# Altium footprint library Apalis Evaluation Board.PcbLib: 212 footprints (part 12 of 14)
Each footprint in its own frame and in the unit in brackets; x right, y up, seen from the top. Pads: shape width x height; smd on the part's side, far side on the other; paste and mask are expansions set on the pad; w line width, h text height; cw(c..) or ccw(c..) is an arc to the next point about the centre after c.
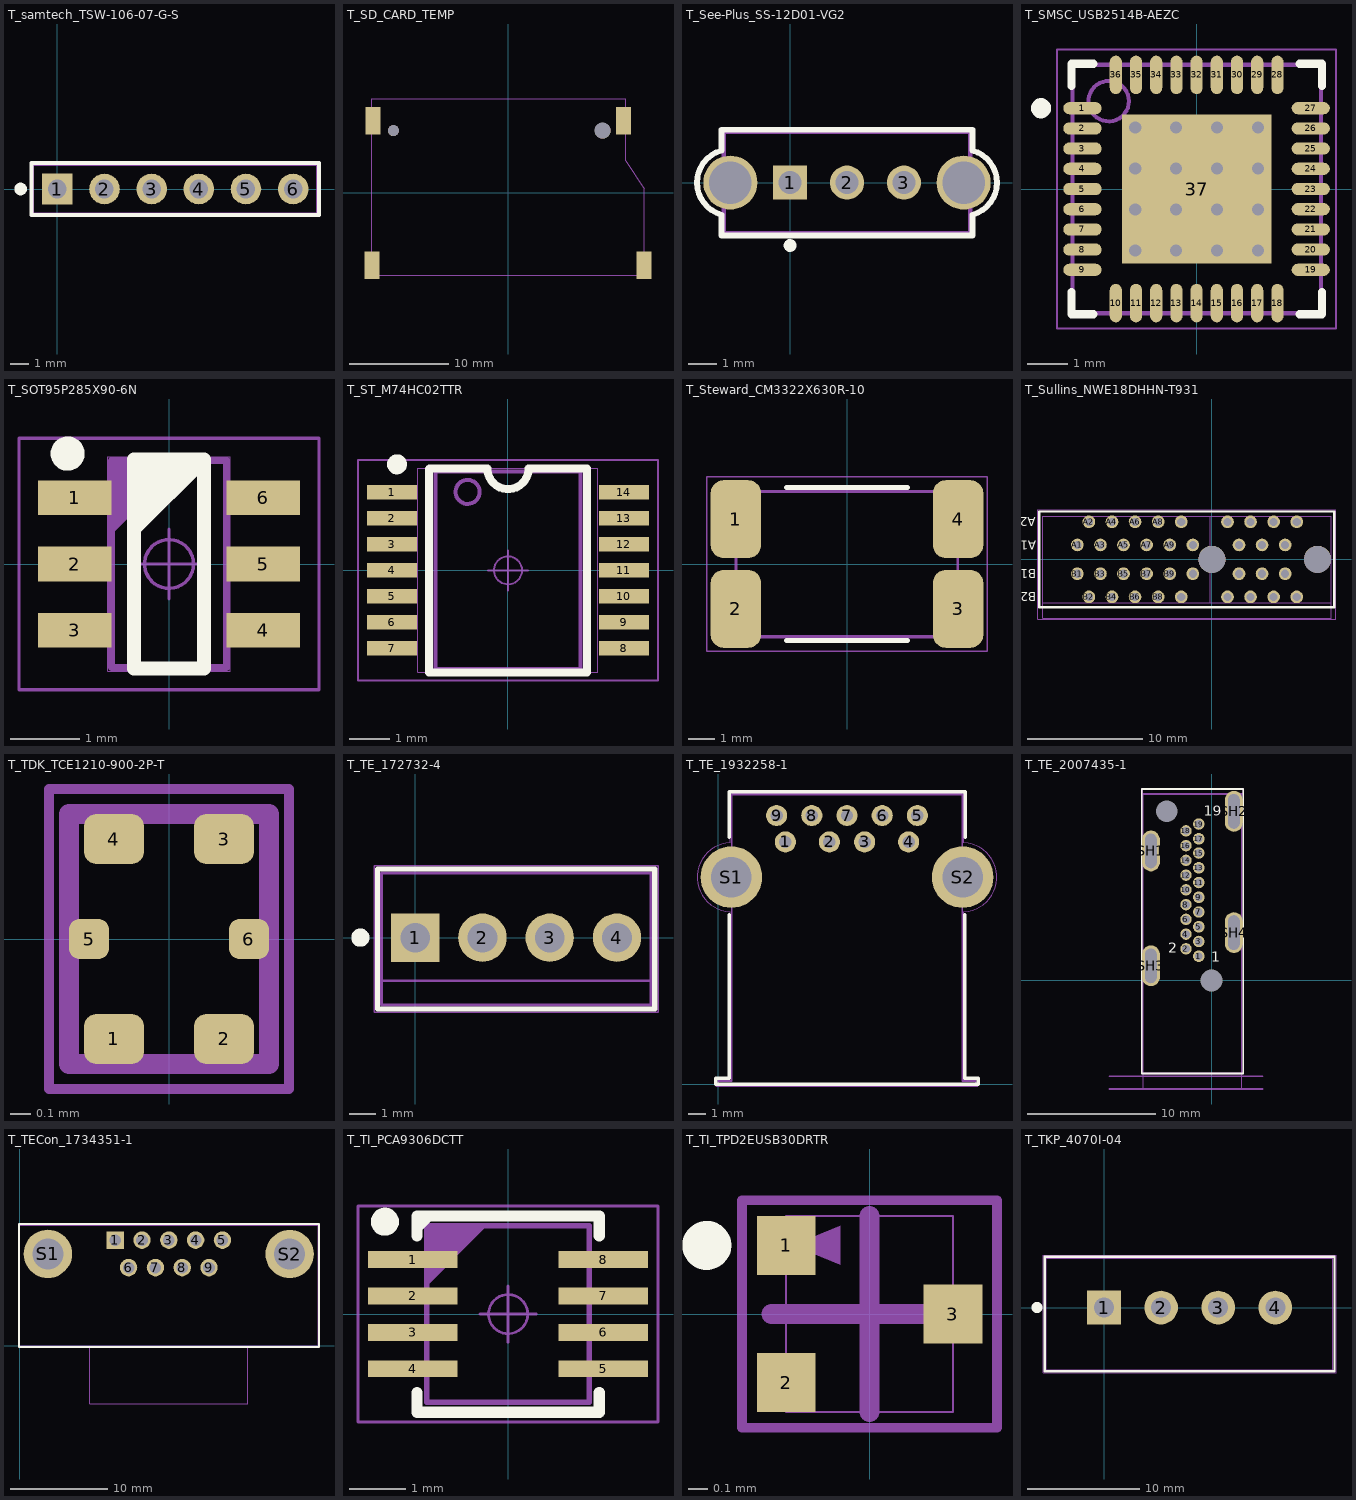
[diagram p11: the footprints below, top view; thin cyan lines are the x and y axes]

## T_samtech_TSW-106-07-G-S [mm] "Connector, Header, 6 Position, 2.54mm pitch"
height 8.4
pads (6):
  rect 1.65x1.65 hole 1: 1(0,0)
  round 1.65 hole 1: 2(2.54,0) 3(5.08,0) 4(7.62,0) 5(10.16,0) 6(12.7,0)
Top Overlay:
  circle w0.5: c-1.975,0 r0.088
  lines w0.2: -1.395,-1.395 -1.395,1.395 14.095,1.395 14.095,-1.395 -1.395,-1.395
Mechanical 1:
  lines w0.05: -1.37,-1.37 -1.37,1.37 14.07,1.37 14.07,-1.37 -1.37,-1.37
Mechanical 2:
  lines w0.01: -1.27,-1.27 -1.27,1.27 13.97,1.27 13.97,-1.27 -1.27,-1.27
Mechanical 3:
  lines w0.1: -1.37,-1.37 14.07,-1.37 14.07,1.37 -1.37,1.37 -1.37,-1.37

## T_SD_CARD_TEMP [mm]
height 2.85
pads (6):
  rect 1.5x2.8 smd: ""(-13.65,-7.25) ""(-13.53,7.25) ""(11.57,7.25) ""(13.65,-7.25)
  round 1.1 hole 1.1: ""(-11.5,6.25)
  round 1.6 hole 1.6: ""(9.5,6.25)
Mechanical 2:
  lines w0.001: -13.68,-8.25 13.68,-8.25 13.68,0.45 11.82,3.25 11.82,9.45 -13.68,9.45 -13.68,-8.25
3D body: height 2.85, standoff 0, extent -13.68,-8.25 13.68,9.45

## T_See-Plus_SS-12D01-VG2 [mm] "Slide Switch"
height 5.5
pads (5):
  rect 1.2x1.2 hole 0.8: 1(0,0)
  round 1.2 hole 0.8: 2(2,0) 3(4,0)
  round 1.9 hole 1.5: ""(-2.1,0) ""(6.1,0)
Top Overlay:
  circle w0.25: c0,-2.21 r0.1
  lines w0.2: -2.423,1.124 ccw(c-2.1,0) -2.422,-1.125 ; -2.41,-1.13 -2.41,-1.86 6.41,-1.86 6.41,-1.13 ; -2.41,1.13 -2.41,1.86 6.41,1.86 6.41,1.13 ; 6.422,1.125 cw(c6.1,0) 6.423,-1.124
Mechanical 1:
  lines w0.05: -2.38,-1.83 -2.38,1.83 6.38,1.83 6.38,-1.83 -2.38,-1.83
Mechanical 2:
  lines w0.001: -2.3,-1.75 -2.3,1.75 6.3,1.75 6.3,-1.75 -2.3,-1.75
Mechanical 3:
  lines w0.1: -2.3,-1.75 6.3,-1.75 6.3,1.75 -2.3,1.75 -2.3,-1.75
3D body: height 6.5, standoff 3.5, extent -0.711,-0.711 0.711,0.711
3D body: height 3.5, standoff 0, extent -2.3,-1.75 6.3,1.75

## T_SMSC_USB2514B-AEZC [mm] "QFN, 36-Leads, Body 6x6mm, Pitch 0.5mm, IPC High Density"
height 1
pads (37):
  oval 0.95x0.3 smd: 1(-2.825,2) 2(-2.825,1.5) 3(-2.825,1) 4(-2.825,0.5) 5(-2.825,0) 6(-2.825,-0.5) 7(-2.825,-1) 8(-2.825,-1.5) 9(-2.825,-2) 19(2.825,-2) 20(2.825,-1.5) 21(2.825,-1) 22(2.825,-0.5) 23(2.825,0) 24(2.825,0.5) 25(2.825,1) 26(2.825,1.5) 27(2.825,2)
  oval 0.3x0.95 smd: 10(-2,-2.825) 11(-1.5,-2.825) 12(-1,-2.825) 13(-0.5,-2.825) 14(0,-2.825) 15(0.5,-2.825) 16(1,-2.825) 17(1.5,-2.825) 18(2,-2.825) 28(2,2.825) 29(1.5,2.825) 30(1,2.825) 31(0.5,2.825) 32(0,2.825) 33(-0.5,2.825) 34(-1,2.825) 35(-1.5,2.825) 36(-2,2.825)
  rect 3.7x3.7 smd paste-3.7: 37(0,0)
via 1.52,1.52 diameter 0.6 hole 0.3
via 1.52,-1.52 diameter 0.6 hole 0.3
via -1.52,-1.52 diameter 0.6 hole 0.3
via -1.52,1.52 diameter 0.6 hole 0.3
via -0.507,1.52 diameter 0.6 hole 0.3
via 0.507,1.52 diameter 0.6 hole 0.3
via -1.52,0.507 diameter 0.6 hole 0.3
via -0.507,0.507 diameter 0.6 hole 0.3
via 0.507,0.507 diameter 0.6 hole 0.3
via 1.52,0.507 diameter 0.6 hole 0.3
via -1.52,-0.507 diameter 0.6 hole 0.3
via -0.507,-0.507 diameter 0.6 hole 0.3
via 0.507,-0.507 diameter 0.6 hole 0.3
via 1.52,-0.507 diameter 0.6 hole 0.3
via -0.507,-1.52 diameter 0.6 hole 0.3
via 0.507,-1.52 diameter 0.6 hole 0.3
Top Overlay:
  circle w0.25: c-3.85,2 r0.125
  lines w0.2: -3.1,-2.55 -3.1,-3.1 -2.55,-3.1 ; -3.1,2.55 -3.1,3.1 -2.55,3.1 ; 2.55,-3.1 3.1,-3.1 3.1,-2.55 ; 2.55,3.1 3.1,3.1 3.1,2.55
Top Paste:
  region: -1.778,0.762 -0.762,0.762 -0.762,1.778 -1.778,1.778
  region: -0.508,0.762 0.508,0.762 0.508,1.778 -0.508,1.778
  region: 0.762,1.778 0.762,0.762 1.778,0.762 1.778,1.778
  region: -1.778,-0.508 -0.762,-0.508 -0.762,0.508 -1.778,0.508
  region: -0.762,-1.778 -0.762,-0.762 -1.778,-0.762 -1.778,-1.778
  region: 0.508,-1.778 0.508,-0.762 -0.508,-0.762 -0.508,-1.778
  region: 1.778,-1.778 1.778,-0.762 0.762,-0.762 0.762,-1.778
  region: 0.509,-0.507 0.509,0.509 -0.507,0.509 -0.507,-0.507
  region: 1.778,-0.508 1.778,0.508 0.762,0.508 0.762,-0.508
Mechanical 1:
  lines w0.05: -3.45,-3.45 3.45,-3.45 3.45,3.45 -3.45,3.45 -3.45,-3.45
Mechanical 2:
  lines w0.001: -3.075,-3.075 3.075,-3.075 3.075,3.075 -3.075,3.075 -3.075,-3.075
Mechanical 3:
  circle w0.1: c-2.175,2.175 r0.5
  lines w0.1: -3.075,-3.075 -3.075,3.075 3.075,3.075 3.075,-3.075 -3.075,-3.075
3D body "User Library-QFN36 (6x6).STEP": height 0.91, standoff 0.01, extent -3.103,-3.103 3.103,3.103

## T_SOT95P285X90-6N [mm]
height 1.45
pads (6):
  rect 1.05x0.5 smd: 1(-1.35,0.95) 2(-1.35,0) 3(-1.35,-0.95) 4(1.35,-0.95) 5(1.35,0) 6(1.35,0.95)
Top Overlay:
  circle w0.25: c-1.453,1.582 r0.12
  lines w0.2: -0.5,0.5 0.5,1.5 ; -0.5,0.7 0.3,1.5 ; -0.5,0.9 0.1,1.5 ; -0.5,1.1 -0.1,1.5 ; -0.5,1.3 -0.3,1.5 ; 0.5,1.5 0.5,-1.5 -0.5,-1.5 -0.5,1.5 0.5,1.5
Mechanical 1:
  circle w0.05: c0,0 r0.35
  lines w0.05: -0.5,0 0.5,0 ; 0,-0.5 0,0.5 ; -2.15,-1.8 2.15,-1.8 2.15,1.8 -2.15,1.8 -2.15,-1.8
Mechanical 2:
  lines w0.001: -0.875,-1.535 0.875,-1.535 0.875,1.535 -0.875,1.535 -0.875,-1.535
Mechanical 3:
  lines w0.1: -0.825,0.485 0.175,1.485 ; -0.825,0.585 0.075,1.485 ; -0.825,0.685 -0.025,1.485 ; -0.825,0.785 -0.125,1.485 ; -0.825,0.885 -0.225,1.485 ; -0.825,0.985 -0.325,1.485 ; -0.825,1.085 -0.425,1.485 ; -0.825,1.185 -0.525,1.485 ; -0.825,1.285 -0.625,1.485 ; -0.825,1.385 -0.725,1.485 ; -0.825,-1.485 0.825,-1.485 0.825,1.485 -0.825,1.485 -0.825,-1.485
3D body: height 1.45, standoff 0, extent -0.875,-1.535 0.875,1.535

## T_ST_M74HC02TTR [mm] "Shrink Small Outline; 14 Leads; Body Width 4.4 mm; Pitch 0.65 mm"
height 1.15
pads (14):
  rect 1.26x0.36 smd: 1(-2.9,1.95) 2(-2.9,1.3) 3(-2.9,0.65) 4(-2.9,0) 5(-2.9,-0.65) 6(-2.9,-1.3) 7(-2.9,-1.95) 8(2.9,-1.95) 9(2.9,-1.3) 10(2.9,-0.65) 11(2.9,0) 12(2.9,0.65) 13(2.9,1.3) 14(2.9,1.95)
Top Overlay:
  circle w0.25: c-2.775,2.65 r0.125
  lines w0.2: -1.97,-2.55 1.97,-2.55 1.97,2.55 0.517,2.55 cw(c0,2.55) -0.517,2.55 -1.959,2.55 -1.97,2.539 -1.97,-2.55
Mechanical 1:
  circle w0.05: c0,0 r0.35
  lines w0.05: -0.5,0 0.5,0 ; 0,-0.5 0,0.5 ; -3.75,-2.75 3.75,-2.75 3.75,2.762 -3.75,2.762 -3.75,-2.75
Mechanical 2:
  lines w0.001: -2.25,-2.55 2.25,-2.55 2.25,2.55 -2.25,2.55 -2.25,-2.55
Mechanical 3:
  circle w0.1: c-1.008,1.961 r0.3
  lines w0.1: -1.817,-2.472 -1.817,2.466 1.815,2.466 1.815,-2.472 -1.817,-2.472
3D body: height 1.15, standoff 0, extent -2.25,-2.55 2.25,2.55

## T_Steward_CM3322X630R-10 [mm] "Common Mode Choke"
height 2.85
pads (4):
  rrect50% 1.91x2.95 smd: 1(-4.22,1.705) 2(-4.22,-1.705) 3(4.22,-1.705) 4(4.22,1.705)
Top Overlay:
  lines w0.2: -2.3,-2.902 2.3,-2.902 ; -2.3,2.904 2.3,2.904
Mechanical 1:
  lines w0.05: -5.316,-3.321 -5.316,3.321 5.316,3.321 5.316,-3.321 -5.316,-3.321
Mechanical 2:
  lines w0.001: -4.25,-2.8 -4.25,2.8 4.25,2.8 4.25,-2.8 -4.25,-2.8
Mechanical 3:
  lines w0.1: -4.2,-2.75 -4.2,2.75 4.2,2.75 4.2,-2.75 -4.2,-2.75

## T_Sullins_NWE18DHHN-T931 [mm] "PCIe X1 Slot"
height 8.8
pads (38):
  round 1.1 hole 0.7: A1(-11.65,1.25) A2(-10.65,3.25) A3(-9.65,1.25) A4(-8.65,3.25) A5(-7.65,1.25) A6(-6.65,3.25) A7(-5.65,1.25) A8(-4.65,3.25) A9(-3.65,1.25) A10(-2.65,3.25) A11(-1.65,1.25) A12(1.35,3.25) A13(2.35,1.25) A14(3.35,3.25) A15(4.35,1.25) A16(5.35,3.25) A17(6.35,1.25) A18(7.35,3.25) B1(-11.65,-1.25) B2(-10.65,-3.25) B3(-9.65,-1.25) B4(-8.65,-3.25) B5(-7.65,-1.25) B6(-6.65,-3.25) B7(-5.65,-1.25) B8(-4.65,-3.25) B9(-3.65,-1.25) B10(-2.65,-3.25) B11(-1.65,-1.25) B12(1.35,-3.25) B13(2.35,-1.25) B14(3.35,-3.25) B15(4.35,-1.25) B16(5.35,-3.25) B17(6.35,-1.25) B18(7.35,-3.25)
  round 2.35 hole 2.35 unplated paste+0 mask+0: ""(0,0) ""(9.15,0)
Top Overlay:
  lines w0.2: -14.95,-4.15 -14.95,4.15 10.6,4.15 10.6,-4.15 -14.95,-4.15
  text "B2" at -15.23,-2.835 h0.76
  text "B1" at -15.23,-0.869 h0.76
  text "A2" at -15.23,3.631 h0.76
  text "A1" at -15.23,1.631 h0.76
Mechanical 1:
  lines w0.05: -15.1,-5.2 10.75,-5.2 10.75,4.3 -15.1,4.3 -15.1,-5.2
Mechanical 2:
  lines w0.01: -14.65,-3.75 10.35,-3.75 ; -0.15,-3.75 -0.15,3.75 ; -14.65,-5.1 -14.65,3.75 10.35,3.75 10.35,-5.1 -14.65,-5.1
Mechanical 3:
  lines w0.1: -14.65,-3.75 10.35,-3.75 ; -14.65,-5.1 10.35,-5.1 10.35,3.75 -14.65,3.75 -14.65,-5.1
3D body "Samtec-PCIE-036-02-D-F-TH.STEP": height 11.04, standoff -4.38, extent -14.63,-4.864 10.363,3.747

## T_TDK_TCE1210-900-2P-T [mm] "Common Mode Choke Super Speed"
height 0.57
pads (6):
  rrect50% 0.3x0.25 smd: 1(-0.275,-0.5) 2(0.275,-0.5) 3(0.275,0.5) 4(-0.275,0.5)
  rrect50% 0.2x0.2 smd: 5(-0.4,0) 6(0.4,0)
Mechanical 1:
  lines w0.05: -0.6,-0.75 -0.6,0.75 0.6,0.75 0.6,-0.75 -0.6,-0.75
Mechanical 2:
  lines w0.01: -0.5,-0.625 0.5,-0.625 0.5,0.625 -0.5,0.625 -0.5,-0.625
Mechanical 3:
  lines w0.1: -0.5,-0.625 0.5,-0.625 0.5,0.625 -0.5,0.625 -0.5,-0.625
3D body: height 0.57, standoff 0, extent -0.5,-0.625 0.5,0.625

## T_TE_172732-4 [mm] "Header vertical with kink, 1x4 Pins, 2.54mm pitch"
height 10.4
pads (4):
  rect 1.8x1.8 hole 1.1: 1(0,0)
  round 1.8 hole 1.1: 2(2.5,0) 3(5,0) 4(7.5,0)
Top Overlay:
  circle w0.5: c-2.038,0 r0.088
  lines w0.2: -1.4,-2.65 8.9,-2.65 8.9,2.55 -1.4,2.55 -1.4,-2.65
Mechanical 1:
  lines w0.05: -1.525,-2.775 9.025,-2.775 9.025,2.675 -1.525,2.675 -1.525,-2.775
Mechanical 2:
  lines w0.01: -1.25,-2.5 8.75,-2.5 8.75,2.4 -1.25,2.4 -1.25,-2.5
Mechanical 3:
  lines w0.1: -1.25,-1.6 8.75,-1.6 ; -1.25,-2.5 -1.25,2.4 8.75,2.4 8.75,-2.5 -1.25,-2.5
3D body "c-0172732-04-3-e-3d.stp": height 10.42, standoff -3.28, extent -1.25,-2.5 8.75,2.4

## T_TE_1932258-1 [mm] "USB 3.0, Type A"
height 7.25
pads (11):
  round 1.2 hole 0.7: 1(3.815,13.78) 2(6.315,13.78) 3(8.315,13.78) 4(10.815,13.78) 5(11.315,15.28) 6(9.315,15.28) 7(7.315,15.28) 8(5.315,15.28) 9(3.315,15.28)
  round 3.5 hole 2.3: S1(0.745,11.78) S2(13.885,11.78)
Top Overlay:
  lines w0.2: 0.615,9.65 0.615,0.36 -0.15,0.36 -0.15,0 14.78,0 14.78,0.36 14.015,0.36 14.015,9.65 ; 0.615,14.06 0.615,16.63 14.02,16.63 14.02,14.06
Mechanical 1:
  lines w0.05: 0.67,13.735 ccw(c0.75,11.779) 0.67,9.823 0.67,0.299 -0.105,0.299 -0.105,-0.099 14.735,-0.099 14.735,0.299 13.96,0.299 13.96,9.824 ccw(c13.88,11.78) 13.959,13.736 13.96,16.575 0.67,16.575 0.67,13.735
Mechanical 2:
  lines w0.001: 0,0 0,0.2 0.765,0.2 0.765,16.48 13.865,16.48 13.865,0.2 14.63,0.2 14.63,0 0,0
Mechanical 3:
  lines w0.1: 0,0 0,0.2 0.765,0.2 0.765,16.48 13.865,16.48 13.865,0.2 14.63,0.2 14.63,0 0,0
3D body "T_TE_1932258-1.stp": height 7.77, standoff -3.68, extent -0.731,0 15.362,16.48

## T_TE_2007435-1 [mm] "CON RECPT HDMI THT R/A W/O FLNG"
height 16.4
pads (25):
  round 0.9 hole 0.6: 1(-1,1.9) 2(-2,2.478) 3(-1,3.055) 4(-2,3.633) 5(-1,4.21) 6(-2,4.788) 7(-1,5.365) 8(-2,5.943) 9(-1,6.52) 10(-2,7.098) 11(-1,7.675) 12(-2,8.253) 13(-1,8.83) 14(-2,9.408) 15(-1,9.985) 16(-2,10.563) 17(-1,11.1) 18(-2,11.718) 19(-1,12.255)
  round 1 hole 1.7: Hole1(0,0) Hole2(-3.5,13.25)
  oval 1.4x3.2 hole 0.9 slot 2.7 at 90 deg: SH1(-4.75,10.15) SH2(1.75,13.25) SH3(-4.75,1.15) SH4(1.75,3.75)
Top Overlay:
  lines w0.127: -5.462,-7.287 -5.462,15 2.484,15 2.484,-7.287 -5.462,-7.287
  text "2" at -3.378,2.154 h0.8
  text "19" at -0.591,12.916 h0.8
  text "1" at -0.03,1.45 h0.8
Mechanical 1:
  lines w0.127: -5.463,-7.285 2.47,-7.285 2.47,14.623 -5.427,14.623 ; -5.443,-7.265 -5.443,14.639
Mechanical 2:
  lines w0.001: -5.35,-8.5 -5.35,14.6 2.35,14.6 2.35,-8.5 -5.35,-8.5
Mechanical 3:
  lines w0.127: -8,-8.5 4,-8.5 ; -8,-7.5 4,-7.5 ; -5.447,15 2.476,15 2.476,-7.278 -5.442,-7.278 -5.442,15
  text "19" at -0.534,12.904 h0.8
  text "1" at 0.011,1.45 h0.8
  text "2" at -3.329,2.23 h0.8
  text "Interior side of back panel" at -13.356,-9.464 h0.8
  text "PCB edge" at -7.696,-7.044 h0.8

## T_TECon_1734351-1 [mm] "9 pin male D-SUB connector"
height 12.55
pads (11):
  rect 1.8x1.8 hole 1.2: 1(9.842,10.932)
  round 1.8 hole 1.2: 2(12.612,10.932) 3(15.382,10.932) 4(18.152,10.932) 5(20.922,10.932) 6(11.227,8.092) 7(13.997,8.092) 8(16.767,8.092) 9(19.537,8.092)
  round 5 hole 3.2: S1(2.887,9.512) S2(27.877,9.499)
Top Overlay:
  lines w0.2: -0.102,-0.101 -0.102,12.602 30.902,12.602 30.902,-0.101 -0.102,-0.101
Mechanical 1:
  lines w0.05: -0.098,-0.094 -0.098,12.598 30.904,12.598 30.904,-0.094 -0.098,-0.094
Mechanical 2:
  lines w0.001: 7.217,0.003 7.217,-6.001 23.547,-6.001 23.547,0.003 ; 0,0 30.801,0 30.801,12.499 0,12.499 0,0
Mechanical 3:
  lines w0.1: -0.098,-0.096 -0.098,12.598 30.904,12.598 30.904,-0.096 -0.098,-0.096
3D body "6180xx211721.stp": height 12.52, standoff -3.98, extent 0,-6.001 30.8,12.499

## T_TI_PCA9306DCTT [mm] "Dual Bidirectional I2C and SMBus Voltage-Level Translator"
height 1.3
pads (8):
  rect 1.6x0.3 smd: 1(-1.7,0.975) 2(-1.7,0.325) 3(-1.7,-0.325) 4(-1.7,-0.975) 5(1.7,-0.975) 6(1.7,-0.325) 7(1.7,0.325) 8(1.7,0.975)
Top Overlay:
  circle w0.25: c-2.2,1.65 r0.125
  lines w0.2: -1.625,-1.4 -1.625,-1.75 1.625,-1.75 1.625,-1.4 ; -1.625,1.4 -1.625,1.75 1.625,1.75 1.625,1.4 ; -1.625,1.55 -1.425,1.75
Mechanical 1:
  circle w0.05: c0,0 r0.35
  lines w0.05: -0.5,0 0.5,0 ; 0,-0.5 0,0.5 ; -2.68,-1.925 -2.68,1.93 2.675,1.93 2.675,-1.925 -2.68,-1.925
Mechanical 2:
  lines w0.001: -1.45,-1.575 1.45,-1.575 1.45,1.575 -1.45,1.575 -1.45,-1.575
Mechanical 3:
  lines w0.1: -1.45,0.57 -0.45,1.57 ; -1.45,0.67 -0.55,1.57 ; -1.45,0.77 -0.65,1.57 ; -1.45,0.87 -0.75,1.57 ; -1.45,0.97 -0.85,1.57 ; -1.45,1.07 -0.95,1.57 ; -1.45,1.17 -1.05,1.57 ; -1.45,1.27 -1.15,1.57 ; -1.45,1.37 -1.25,1.57 ; -1.45,1.47 -1.35,1.57 ; -1.45,-1.575 -1.45,1.575 1.45,1.575 1.45,-1.575 -1.45,-1.575
3D body: height 1.3, standoff 0, extent -1.45,-1.575 1.45,1.575

## T_TI_TPD2EUSB30DRTR [mm] "2 CHANNEL PROTECTION SOLUTION FOR SUPER-SPEED"
height 0.5
pads (3):
  rect 0.3x0.3 smd: 1(-0.425,0.35) 2(-0.425,-0.35) 3(0.425,0)
Top Overlay:
  circle w0.15: c-0.83,0.35 r0.05
Mechanical 1:
  lines w0.05: -0.65,-0.58 -0.65,0.58 0.65,0.58 0.65,-0.58 -0.65,-0.58
Mechanical 2:
  lines w0.01: -0.425,-0.5 0.425,-0.5 0.425,0.5 -0.425,0.5 -0.425,-0.5
Mechanical 3:
  region: -0.39,0.35 -0.15,0.45 -0.15,0.25
  lines w0.1: -0.5,0 0.5,0 ; 0,-0.5 0,0.5
3D body: height 0.5, standoff 0, extent -0.425,-0.5 0.425,0.5

## T_TKP_4070I-04 [mm] "Molex Power OUT Connector"
height 11.5
pads (4):
  rect 3x3 hole 1.78: 1(0,0)
  round 3 hole 1.78: 2(5.08,0) 3(10.16,0) 4(15.24,0)
Top Overlay:
  circle w0.8: c-5.968,0 r0.088
  lines w0.2: -5.28,-5.675 -5.28,4.525 20.52,4.525 20.52,-5.675 -5.28,-5.675
Mechanical 1:
  lines w0.05: -5.405,-5.8 -5.405,4.65 20.645,4.65 20.645,-5.8 -5.405,-5.8
Mechanical 2:
  lines w0.01: -5.13,-5.525 20.37,-5.525 20.37,4.375 -5.13,4.375 -5.13,-5.525
Mechanical 3:
  lines w0.1: -5.13,-5.525 20.37,-5.525 20.37,4.375 -5.13,4.375 -5.13,-5.525
3D body "4070I-XX.STEP": height 11.22, standoff -4.28, extent -5.13,-5.525 20.37,4.375